# Altium footprint library TH Connectors.PcbLib: 140 footprints (part 6 of 9)
Each footprint in its own frame and in the unit in brackets; x right, y up, seen from the top. Pads: shape width x height; smd on the part's side, far side on the other; paste and mask are expansions set on the pad; w line width, h text height; cw(c..) or ccw(c..) is an arc to the next point about the centre after c.
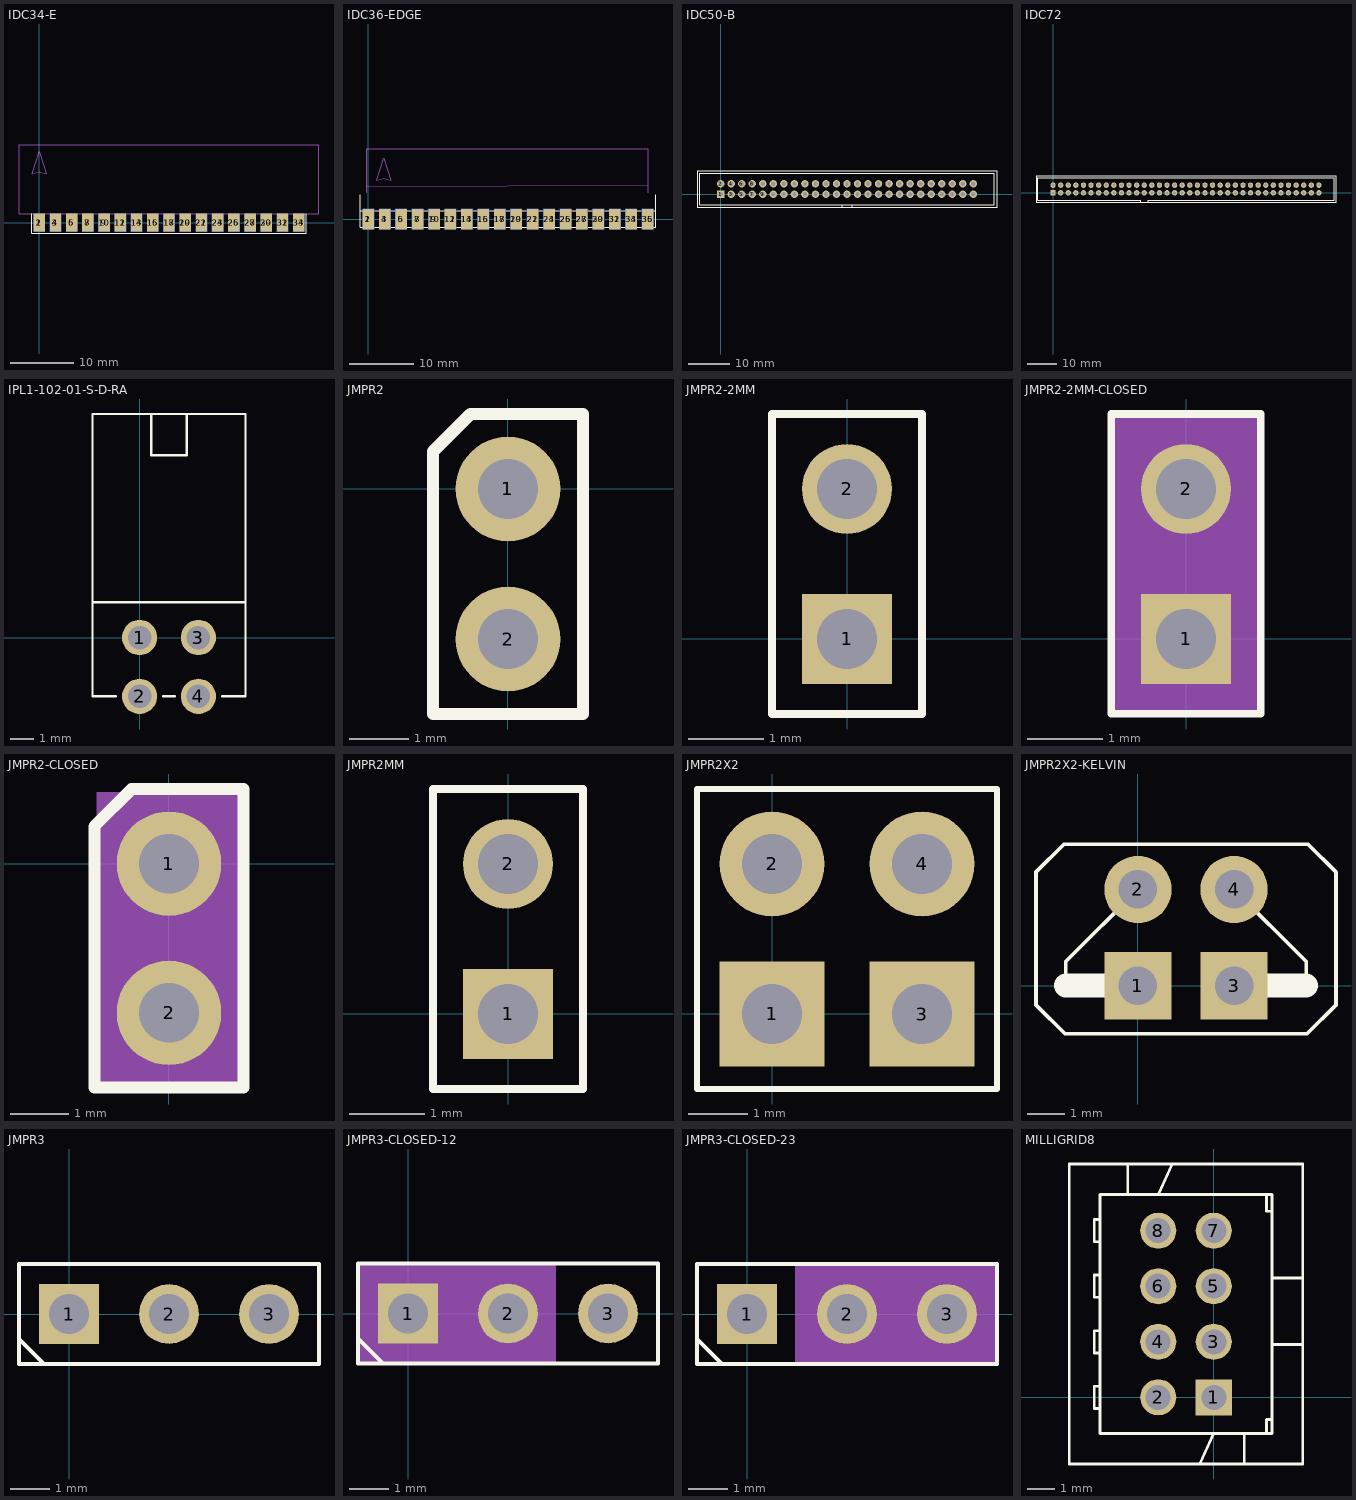
[diagram p5: the footprints below, top view; thin cyan lines are the x and y axes]

## IDC34-E [mil]
pads (34):
  rect 70x110.24 smd far side: 1(0,0) 3(100,0) 5(200,0) 7(300,0) 9(400,0) 11(500,0) 13(600,0) 15(700,0) 17(800,0) 19(900,0) 21(1000,0) 23(1100,0) 25(1200,0) 27(1300,0) 29(1400,0) 31(1500,0) 33(1600,0)
  rect 70x110.24 smd: 2(0,0) 4(100,0) 6(200,0) 8(300,0) 10(400,0) 12(500,0) 14(600,0) 16(700,0) 18(800,0) 20(900,0) 22(1000,0) 24(1100,0) 26(1200,0) 28(1300,0) 30(1400,0) 32(1500,0) 34(1600,0)
Top Overlay:
  lines w4: -45,55 -45,-65 800,-65 1645,-65 1645,55
Mechanical 1:
  lines w4: -125,55 -125,480 800,480 1725,480 1725,55 800,55 -125,55
  lines w6: -2,315 42,303 -1,436 -44,303 0,315

## IDC36-EDGE [mil]
pads (36):
  rect 70x125.98 smd far side: 1(0,0) 3(100,0) 5(200,0) 7(300,0) 9(400,0) 11(500,0) 13(600,0) 15(700,0) 17(800,0) 19(900,0) 21(1000,0) 23(1100,0) 25(1200,0) 27(1300,0) 29(1400,0) 31(1500,0) 33(1600,0) 35(1700,0)
  rect 70x125.98 smd: 2(0,0) 4(100,0) 6(200,0) 8(300,0) 10(400,0) 12(500,0) 14(600,0) 16(700,0) 18(800,0) 20(900,0) 22(1000,0) 24(1100,0) 26(1200,0) 28(1300,0) 30(1400,0) 32(1500,0) 34(1600,0) 36(1700,0)
Top Overlay:
  lines w6: -50,50 1750,50 ; -50,150 -50,-50 1750,-50 1750,150
Mechanical 1:
  lines w6: -10,160 -10,430 575,430 1705,430 1705,160 ; -10,200 1705,205 ; 93,250 137,238 94,371 51,238 95,250

## IDC50-B [mil]
pads (50):
  rect 70x70 hole 40: 1(0,0)
  round 70 hole 40: 2(0,100) 3(100,0) 4(100,100) 5(200,0) 6(200,100) 7(300,0) 8(300,100) 9(400,0) 10(400,100) 11(500,0) 12(500,100) 13(600,0) 14(600,100) 15(700,0) 16(700,100) 17(800,0) 18(800,100) 19(900,0) 20(900,100) 21(1000,0) 22(1000,100) 23(1100,0) 24(1100,100) 25(1200,0) 26(1200,100) 27(1300,0) 28(1300,100) 29(1400,0) 30(1400,100) 31(1500,0) 32(1500,100) 33(1600,0) 34(1600,100) 35(1700,0) 36(1700,100) 37(1800,0) 38(1800,100) 39(1900,0) 40(1900,100) 41(2000,0) 42(2000,100) 43(2100,0) 44(2100,100) 45(2200,0) 46(2200,100) 47(2300,0) 48(2300,100) 49(2400,0) 50(2400,100)
Top Overlay:
  lines w5: 150,-100 2600,-100 2600,200 -200,200 -200,-100 250,-100 ; 1150,-125 1150,-100 ; 1250,-125 1250,-100 ; -225,-125 -225,225 2625,225 2625,-125 -225,-125

## IDC72 [mil]
pads (72):
  rect 70x70 hole 40: 1(0,0)
  round 70 hole 40: 2(0,100) 3(100,0) 4(100,100) 5(200,0) 6(200,100) 7(300,0) 8(300,100) 9(400,0) 10(400,100) 11(500,0) 12(500,100) 13(600,0) 14(600,100) 15(700,0) 16(700,100) 17(800,0) 18(800,100) 19(900,0) 20(900,100) 21(1000,0) 22(1000,100) 23(1100,0) 24(1100,100) 25(1200,0) 26(1200,100) 27(1300,0) 28(1300,100) 29(1400,0) 30(1400,100) 31(1500,0) 32(1500,100) 33(1600,0) 34(1600,100) 35(1700,0) 36(1700,100) 37(1800,0) 38(1800,100) 39(1900,0) 40(1900,100) 41(2000,0) 42(2000,100) 43(2100,0) 44(2100,100) 45(2200,0) 46(2200,100) 47(2300,0) 48(2300,100) 49(2400,0) 50(2400,100) 51(2500,0) 52(2500,100) 53(2600,0) 54(2600,100) 55(2700,0) 56(2700,100) 57(2800,0) 58(2800,100) 59(2900,0) 60(2900,100) 61(3000,0) 62(3000,100) 63(3100,0) 64(3100,100) 65(3200,0) 66(3200,100) 67(3300,0) 68(3300,100) 69(3400,0) 70(3400,100) 71(3500,0) 72(3500,100)
Top Overlay:
  lines w8: 1150,-125 1150,-100 -200,-100 -200,200 3700,200 3700,-100 1250,-100 1250,-125 ; -225,-125 -225,225 3725,225 3725,-125 -225,-125

## IPL1-102-01-S-D-RA [mil]
pads (4):
  round 60 hole 40: 1(0,0) 2(0,-100) 3(100,0) 4(100,-100)
Top Overlay:
  lines w4: -40,-100 -80,-100 -80,60 ; 20,380 20,310 50,310 80,310 80,380 ; 40,-100 60,-100 ; 40,380 180,380 180,60 50,60 -80,60 ; 60,380 -80,380 -80,60 ; 140,-100 180,-100 180,100
3D body: height 160, standoff 120, extent 84.5,-114.5 116,66
3D body: height 160, standoff 0, extent 84.5,-114.5 116,-85
3D body: height 160, standoff 0, extent -15.5,-114.5 16,-85
3D body: height 160, standoff 120, extent -15.5,-114.5 16,66
3D body: height 80, standoff 0, extent 84.5,-14.5 116,15
3D body: height 80, standoff 40, extent 84.5,-14.5 116,66
3D body: height 80, standoff 40, extent -15.5,-14.5 16,66
3D body: height 80, standoff 0, extent -15.5,-14.5 16,15
3D body: height 200, standoff 0, extent -80,60 180,380

## JMPR2 [mil]
pads (2):
  round 70 hole 40: 1(0,0) 2(0,-100)
Top Overlay:
  lines w8: -50,-150 50,-150 50,50 -25,50 -50,25 -50,-150
3D body: height 300, standoff -120, extent -15,-115.25 15,-85.25
3D body: height 300, standoff -120, extent -15,-15.25 15,14.75
3D body: height 100, standoff 0, extent -50,-150.43 50,50

## JMPR2-2MM [mm] "2 PIN JUMPER 2MM PITCH"
pads (2):
  rect 1.2x1.2 hole 0.8: 1(0,0)
  round 1.2 hole 0.8: 2(0,2)
Top Overlay:
  lines w0.102: -1,-1 0,-1 1,-1 1,3 0,3 -1,3 -1,-1
3D body: height 2.54, standoff 0, extent -1.003,-1.009 1.003,2.997
3D body: height 7.62, standoff -3.05, extent -0.381,-0.381 0.381,0.381
3D body: height 7.62, standoff -3.05, extent -0.381,1.626 0.381,2.388

## JMPR2-2MM-CLOSED [mm] "2 PIN JUMPER 2MM PITCH"
pads (2):
  rect 1.2x1.2 hole 0.8: 1(0,0)
  round 1.2 hole 0.8: 2(0,2)
Top Overlay:
  lines w0.102: -1,-1 0,-1 1,-1 1,3 0,3 -1,3 -1,-1
Mechanical 2:
  rectangle: -0.991,-1.003 0.991,2.984
Mechanical 3:
  rectangle: -1.003,-1.003 1.003,2.997
3D body: height 2.54, standoff 0, extent -1.003,-1.009 1.003,2.997
3D body: height 7.62, standoff -3.05, extent -0.381,-0.381 0.381,0.381
3D body: height 7.62, standoff -3.05, extent -0.381,1.626 0.381,2.388
3D body: height 7.11, standoff 6.35, extent -0.953,-0.953 0.953,2.946
3D body: height 6.35, standoff 5.59, extent -0.775,-0.787 0.8,2.788
3D body: height 5.59, standoff 2.54, extent -0.965,-0.953 0.953,2.946

## JMPR2-CLOSED [mil]
pads (2):
  round 70 hole 40: 1(0,0) 2(0,-100)
Top Overlay:
  lines w8: -50,-150 -50,25 -25,50 50,50 50,-150 -50,-150
Mechanical 2:
  rectangle: -48,-151 49.5,48
Mechanical 3:
  rectangle: -48.5,-148 48.5,48
3D body: height 280, standoff 250, extent -48,-152 48,48
3D body: height 250, standoff 220, extent -41,-144 40,39.5
3D body: height 220, standoff 100, extent -48,-152 48,48
3D body: height 100, standoff 0, extent -50,-150.43 50,50
3D body: height 300, standoff -120, extent -15,-15.25 15,14.75
3D body: height 300, standoff -120, extent -15,-115.25 15,-85.25

## JMPR2MM [mm]
pads (2):
  rect 1.2x1.2 hole 0.8: 1(0,0)
  round 1.2 hole 0.8: 2(0,2)
Top Overlay:
  lines w0.102: -1,-1 -1,3 0,3 1,3 1,-1 0,-1 -1,-1
3D body: height 7.62, standoff -3.05, extent -0.381,1.626 0.381,2.388
3D body: height 7.62, standoff -3.05, extent -0.381,-0.381 0.381,0.381

## JMPR2X2 [mil]
pads (4):
  rect 70x70 hole 40: 1(0,0) 3(100,0)
  round 70 hole 40: 2(0,100) 4(100,100)
Top Overlay:
  lines w4: -50,-50 50,-50 150,-50 150,150 -50,150 -50,-50
3D body: height 470, standoff -120, extent -15,85 15,115
3D body: height 470, standoff -120, extent -15,-15 15,15
3D body: height 100, standoff 0, extent -50,-50 150,150
3D body: height 470, standoff -120, extent 85,85 115,115
3D body: height 470, standoff -120, extent 85,-15 115,15

## JMPR2X2-KELVIN [mil]
pads (4):
  rect 70x70 hole 40: 1(0,0) 3(100,0)
  round 70 hole 40: 2(0,100) 4(100,100)
Top Overlay:
  lines w4: -75,0 -75,25 0,100 ; 2,147 177,147 206,118 206,-20 176,-50 150,-50 50,-50 -50,-50 -76,-50 -106,-20 -106,118 -77,147 98,147 ; 100,100 175,25 175,0
  lines w25: 0,0 -75,0 ; 100,0 175,0 ; -75,0 -75,0
3D body: height 470, standoff -120, extent -15,85 15,115
3D body: height 470, standoff -120, extent -15,-15 15,15
3D body: height 100, standoff 0, extent -50,-50 150,150
3D body: height 470, standoff -120, extent 85,85 115,115
3D body: height 470, standoff -120, extent 85,-15 115,15

## JMPR3 [mil]
pads (3):
  rect 60x60 hole 40: 1(0,0)
  round 60 hole 40: 2(100,0) 3(200,0)
Top Overlay:
  lines w4: -50,-25 -50,50 250,50 250,-50 -25,-50 ; -50,-25 -25,-50 ; -50,-25 -50,-50 -25,-50
3D body: height 100, standoff 0, extent -49.93,-50 250,50
3D body: height 300, standoff -120, extent 185,-15 215,15
3D body: height 300, standoff -120, extent 85,-15.25 115,14.75
3D body: height 300, standoff -120, extent -15,-15.25 15,14.75

## JMPR3-CLOSED-12 [mil]
pads (3):
  rect 60x60 hole 40: 1(0,0)
  round 60 hole 40: 2(100,0) 3(200,0)
Top Overlay:
  lines w4: -50,-25 -50,-50 -25,-50 ; -50,-25 -25,-50 ; -50,-25 -50,50 250,50 250,-50 -25,-50
Mechanical 3:
  rectangle: -49.5,-51 148,49.5
3D body: height 300, standoff -120, extent -15,-15.25 15,14.75
3D body: height 300, standoff -120, extent 85,-15.25 115,14.75
3D body: height 300, standoff -120, extent 185,-15 215,15
3D body: height 100, standoff 0, extent -49.93,-50 250,50
3D body: height 220, standoff 100, extent -52,-48 148,48
3D body: height 250, standoff 220, extent -44,-40 139.5,41
3D body: height 280, standoff 250, extent -52,-48 148,48

## JMPR3-CLOSED-23 [mil]
pads (3):
  rect 60x60 hole 40: 1(0,0)
  round 60 hole 40: 2(100,0) 3(200,0)
Top Overlay:
  lines w4: -50,-25 -50,50 250,50 250,-50 -25,-50 ; -50,-25 -25,-50 ; -50,-25 -50,-50 -25,-50
Mechanical 3:
  rectangle: 48,-50.5 249.5,50.5
3D body: height 280, standoff 250, extent 48,-48 248,48
3D body: height 250, standoff 220, extent 56,-40 239.5,41
3D body: height 220, standoff 100, extent 48,-48 248,48
3D body: height 100, standoff 0, extent -49.93,-50 250,50
3D body: height 300, standoff -120, extent 185,-15 215,15
3D body: height 300, standoff -120, extent 85,-15.25 115,14.75
3D body: height 300, standoff -120, extent -15,-15.25 15,14.75

## MILLIGRID8 [mm]
pads (8):
  rect 1.3x1.3 hole 0.9: 1(0,0)
  round 1.3 hole 0.9: 2(-2,0) 3(0,2) 4(-2,2) 5(0,4) 6(-2,4) 7(0,6) 8(-2,6)
Top Overlay:
  lines w0.102: -4.1,-0.4 -4.3,-0.4 -4.3,0.2 -4.3,0.4 -4.1,0.4 ; -4.1,1.6 -4.3,1.6 -4.3,2.2 -4.3,2.4 -4.1,2.4 ; -4.1,3.6 -4.3,3.6 -4.3,4.2 -4.3,4.4 -4.1,4.4 ; -4.1,5.6 -4.3,5.6 -4.3,6.2 ; -3.1,7.3 -3.1,8.4 ; -2,7.3 -1.5,8.4 ; -0.5,-2.4 0,-1.3 ; 1.1,-2.4 1.1,-1.3 ; 1.9,-1.3 1.9,-0.8 2.1,-0.8 ; 1.9,7.3 1.9,6.7 2.1,6.7 ; 2.1,1.9 3.2,1.9 ; 2.1,4.3 3.2,4.3 ; -4.3,6.2 -4.3,6.4 ; -4.3,6.2 -4.3,6.4 ; -4.3,6.2 -4.3,6.4 ; -4.3,6.4 -4.1,6.4 ; -4.3,6.4 -4.1,6.4 ; -4.3,6.4 -4.1,6.4 ; -5.2,-2.4 -5.2,0 -5.2,8.4 -1,8.4 3.2,8.4 3.2,-2.4 -1,-2.4 -5.2,-2.4 ; -4.3,8.4 -4.1,8.4 -4.3,8.4 ; -4.1,-1.3 -4.1,0 -4.1,7.3 -2.8,7.3 -1,7.3 0.8,7.3 2.1,7.3 2.1,0 2.1,-1.3 0.8,-1.3 -1,-1.3 -2.8,-1.3 -4.1,-1.3